# Altium footprint library connectors.PCBLIB: 188 footprints (part 1 of 12)
Each footprint in its own frame and in the unit in brackets; x right, y up, seen from the top. Pads: shape width x height; smd on the part's side, far side on the other; paste and mask are expansions set on the pad; w line width, h text height; cw(c..) or ccw(c..) is an arc to the next point about the centre after c.
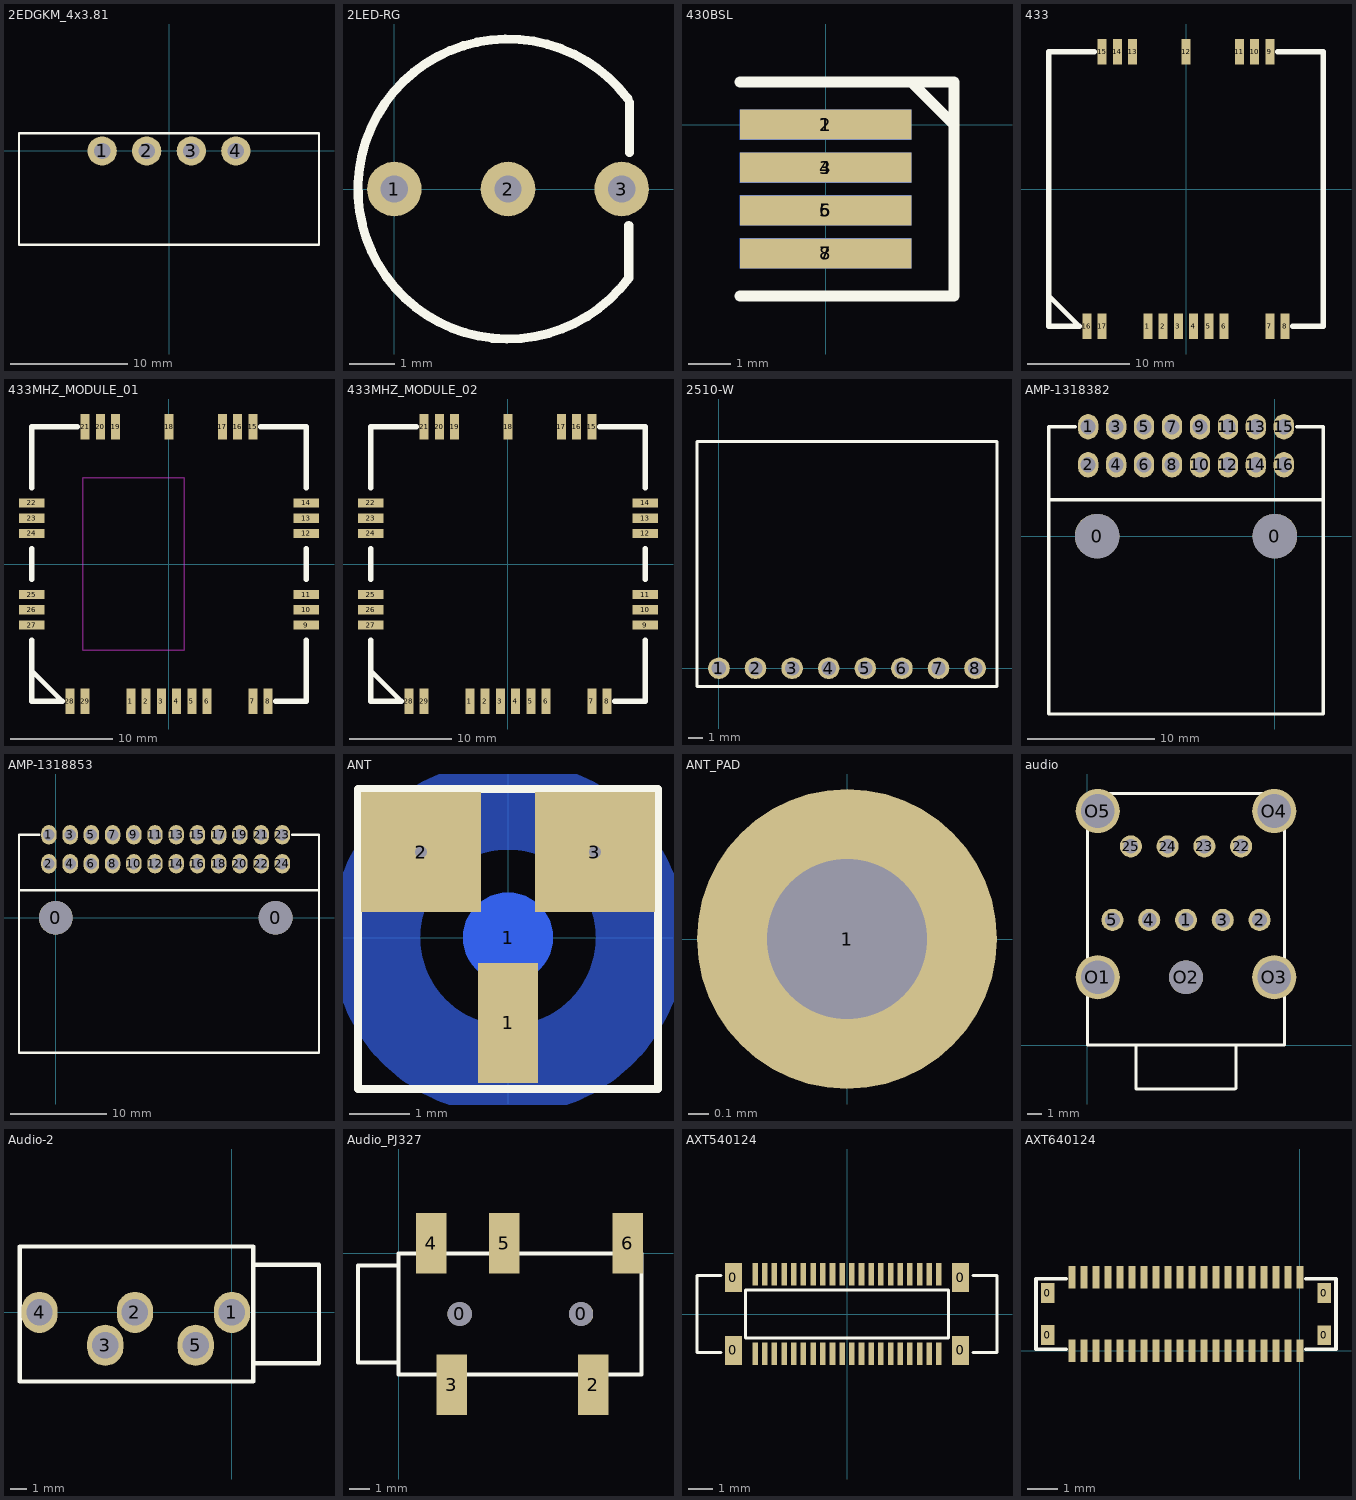
[diagram p0: the footprints below, top view; thin cyan lines are the x and y axes]

## 2EDGKM_4x3.81 [mm]
pads (4):
  round 2.5 hole 1.4: 1(-5.715,0) 2(-1.905,0) 3(1.905,0) 4(5.715,0)
Top Overlay:
  lines w0.203: -12.82,-8 -12.82,1.5 12.82,1.5 12.82,-8 -12.82,-8

## 2LED-RG [mm]
pads (3):
  round 1.2 hole 0.6: 1(0,0) 2(2.5,0) 3(5,0)
Top Overlay:
  lines w0.2: 5.136,1.985 ccw(c2.5,0) 5.157,-1.958 5.157,-0.8 ; 5.172,0.8 5.172,1.9

## 430BSL [mm]
pads (8):
  rect 4x0.7 smd: 1(0,0) 3(0,-1) 5(0,-2) 7(0,-3)
  rect 4x0.7 smd far side: 2(0,0) 4(0,-1) 6(0,-2) 8(0,-3)
Top Overlay:
  lines w0.254: -2,-4 3,-4 3,-2 3,1 -2,1 ; 3,0 2,1 ; 2,1 2,1
Bottom Overlay:
  lines w0.254: -2,-4 3,-4 3,1 -2,1

## 433 [mm]
pads (17):
  rect 0.9x2.5 smd: 1(-3.75,-13.5) 2(-2.25,-13.5) 3(-0.75,-13.5) 4(0.75,-13.5) 5(2.25,-13.5) 6(3.75,-13.5) 7(8.25,-13.5) 8(9.75,-13.5) 9(8.25,13.5) 10(6.75,13.5) 11(5.25,13.5) 12(0,13.5) 13(-5.25,13.5) 14(-6.75,13.5) 15(-8.25,13.5) 16(-9.75,-13.5) 17(-8.25,-13.5)
Top Overlay:
  lines w0.1: -13.5,-13.5 -10.5,-13.5 -13.5,-13.5
  lines w0.5: -13.5,-10.5 -10.5,-13.5 ; -9,13.5 -13.5,13.5 -13.5,7.5 -13.5,-7.5 -13.5,-13.5 -10.5,-13.5 ; 9,13.5 13.5,13.5 13.5,7.5 13.5,-7.5 13.5,-13.5 10.5,-13.5 ; -10.5,-13.5 -10.5,-13.5

## 433MHZ_MODULE_01 [mm]
pads (29):
  rect 0.9x2.5 smd: 1(-3.75,-13.5) 2(-2.25,-13.5) 3(-0.75,-13.5) 4(0.75,-13.5) 5(2.25,-13.5) 6(3.75,-13.5) 7(8.25,-13.5) 8(9.75,-13.5) 15(8.25,13.5) 16(6.75,13.5) 17(5.25,13.5) 18(0,13.5) 19(-5.25,13.5) 20(-6.75,13.5) 21(-8.25,13.5) 28(-9.75,-13.5) 29(-8.25,-13.5)
  rect 2.5x0.9 smd: 9(13.5,-6) 10(13.5,-4.5) 11(13.5,-3) 12(13.5,3) 13(13.5,4.5) 14(13.5,6) 22(-13.5,6) 23(-13.5,4.5) 24(-13.5,3) 25(-13.5,-3) 26(-13.5,-4.5) 27(-13.5,-6)
Top Overlay:
  lines w0.1: -13.5,-13.5 -10.5,-13.5 -13.5,-13.5
  lines w0.5: -13.5,-10.5 -10.5,-13.5 ; -13.5,-7.5 -13.5,-13.5 -10.5,-13.5 ; -13.5,-1.5 -13.5,1.5 ; -13.5,7.5 -13.5,13.5 -9,13.5 ; 9,13.5 13.5,13.5 13.5,7.5 ; 10.5,-13.5 13.5,-13.5 13.5,-7.5 ; 13.5,-1.5 13.5,1.5 ; -10.5,-13.5 -10.5,-13.5
Keep-Out Layer:
  lines w0.127: -8.5,-8.5 1.5,-8.5 1.5,8.5 -8.5,8.5 -8.5,-8.5

## 433MHZ_MODULE_02 [mm]
pads (29):
  rect 0.9x2.5 smd: 1(-3.75,-13.5) 2(-2.25,-13.5) 3(-0.75,-13.5) 4(0.75,-13.5) 5(2.25,-13.5) 6(3.75,-13.5) 7(8.25,-13.5) 8(9.75,-13.5) 15(8.25,13.5) 16(6.75,13.5) 17(5.25,13.5) 18(0,13.5) 19(-5.25,13.5) 20(-6.75,13.5) 21(-8.25,13.5) 28(-9.75,-13.5) 29(-8.25,-13.5)
  rect 2.5x0.9 smd: 9(13.5,-6) 10(13.5,-4.5) 11(13.5,-3) 12(13.5,3) 13(13.5,4.5) 14(13.5,6) 22(-13.5,6) 23(-13.5,4.5) 24(-13.5,3) 25(-13.5,-3) 26(-13.5,-4.5) 27(-13.5,-6)
Top Overlay:
  lines w0.1: -13.5,-13.5 -10.5,-13.5 -13.5,-13.5
  lines w0.5: -13.5,-10.5 -10.5,-13.5 ; -13.5,-7.5 -13.5,-13.5 -10.5,-13.5 ; -13.5,-1.5 -13.5,1.5 ; -13.5,7.5 -13.5,13.5 -9,13.5 ; 9,13.5 13.5,13.5 13.5,7.5 ; 10.5,-13.5 13.5,-13.5 13.5,-7.5 ; 13.5,-1.5 13.5,1.5 ; -10.5,-13.5 -10.5,-13.5

## 2510-W [mm]
pads (8):
  round 1.5 hole 1: 1(0,0) 2(2.54,0) 3(5.08,0) 4(7.62,0) 5(10.16,0) 6(12.7,0) 7(15.24,0) 8(17.78,0)
Top Overlay:
  lines w0.2: -1.524,-1.27 -1.524,15.748 19.304,15.748 19.304,-1.27 -1.524,-1.27

## AMP-1318382 [mm]
pads (18):
  round 3.5 hole 3.5: 0(-14,0) 0(0,0)
  oval 1.6x2 hole 1.2: 1(-14.7,8.6) 2(-14.7,5.6) 3(-12.5,8.6) 4(-12.5,5.6) 5(-10.3,8.6) 6(-10.3,5.6) 7(-8.1,8.6) 8(-8.1,5.6) 9(-5.9,8.6) 10(-5.9,5.6) 11(-3.7,8.6) 12(-3.7,5.6) 13(-1.5,8.6) 14(-1.5,5.6) 15(0.7,8.6) 16(0.7,5.6)
Top Overlay:
  lines w0.254: -17.8,2.85 3.8,2.85 ; -15.7,8.6 -17.8,8.6 ; 1.7,8.6 3.8,8.6 3.8,-14 -17.8,-14 -17.8,8.6 ; -17.8,8.6 -17.8,8.6

## AMP-1318853 [mm]
pads (26):
  round 3.5 hole 3.5: 0(0,0) 0(22.8,0)
  oval 1.6x2 hole 1.2: 1(-0.7,8.6) 2(-0.7,5.6) 3(1.5,8.6) 4(1.5,5.6) 5(3.7,8.6) 6(3.7,5.6) 7(5.9,8.6) 8(5.9,5.6) 9(8.1,8.6) 10(8.1,5.6) 11(10.3,8.6) 12(10.3,5.6) 13(12.5,8.6) 14(12.5,5.6) 15(14.7,8.6) 16(14.7,5.6) 17(16.9,8.6) 18(16.9,5.6) 19(19.1,8.6) 20(19.1,5.6) 21(21.3,8.6) 22(21.3,5.6) 23(23.5,8.6) 24(23.5,5.6)
Top Overlay:
  lines w0.254: -3.8,2.85 27.3,2.85 ; -1.7,8.6 -3.8,8.6 ; 24.5,8.6 27.3,8.6 27.3,-14 -3.8,-14 -3.8,8.6 ; -3.8,8.6 -3.8,8.6

## ANT [mm]
pads (4):
  rect 1x2 smd mask+0.051: 1(0,-1.425)
  round 1.5 smd far side: 1(0,0)
  rect 2x2 smd mask+0.051: 2(-1.45,1.425) 3(1.45,1.425)
via 1.45,1.425 diameter 0.406 hole 0.203
via -1.45,1.425 diameter 0.406 hole 0.203
Bottom Layer:
  circle w1.5: c0,0 r2.214
Top Overlay:
  lines w0.14: -2.5,-2.525 -2.5,2.475 2.5,2.475 2.5,-2.525 -2.5,-2.525
Bottom Solder:
  circle w1.5: c0,0 r2.215

## ANT_PAD [mm]
pads (1):
  round 1.5 hole 0.8: 1(0,0)

## audio [mm]
pads (14):
  round 1.5 hole 1: 1(6.7,8.518) 2(11.7,8.518) 3(9.2,8.518) 4(4.2,8.518) 5(1.7,8.518) 22(10.45,13.518) 23(7.95,13.518) 24(5.45,13.518) 25(2.95,13.518)
  round 3 hole 2.3: O1(0.7,4.618) O3(12.7,4.618) O4(12.7,15.918) O5(0.7,15.918)
  round 2.3 hole 2.3: O2(6.7,4.618)
Top Overlay:
  lines w0.203: 0,0 13.401,0 ; 0,0.068 0,17.1 13.401,17.1 ; 3.33,0 3.304,-0.026 3.304,-2.977 10.038,-2.977 10.083,-2.932 10.083,0 ; 13.401,0 13.401,17.1 ; 13.401,0 13.401,17.1

## Audio-2 [mm]
pads (5):
  oval 2.2x2.5 hole 1.6: 1(0,0) 2(-5.9,0) 3(-7.7,-2) 4(-11.7,0) 5(-2.2,-2)
Top Overlay:
  lines w0.254: 1.3,-3.1 5.3,-3.1 5.3,2.9 1.3,2.9 ; -12.9,-4.2 -12.9,4 1.3,4 1.3,-4.2 -12.9,-4.2

## Audio_PJ327 [mm]
pads (7):
  round 1.2 hole 1.2: 0(3,-3) 0(9,-3)
  rect 1.5x3 smd: 2(9.6,-6.5) 3(2.6,-6.5) 4(1.6,0.5) 5(5.2,0.5) 6(11.3,0.5)
Top Overlay:
  lines w0.2: -0.024,-6 -0.024,0 11.976,0 11.976,-6 -0.024,-6
  lines w0.203: -0.024,-5.4 -2.024,-5.4 -2.024,-0.6 -0.024,-0.6

## AXT540124 [mm]
pads (44):
  rect 0.7x1.2 smd: 0(-4.7,-1.5) 0(-4.7,1.5) 0(4.7,-1.5) 0(4.7,1.5)
  rect 0.23x0.92 smd: 1(-3.8,-1.64) 2(-3.8,1.64) 3(-3.4,-1.64) 4(-3.4,1.64) 5(-3,-1.64) 6(-3,1.64) 7(-2.6,-1.64) 8(-2.6,1.64) 9(-2.2,-1.64) 10(-2.2,1.64) 11(-1.8,-1.64) 12(-1.8,1.64) 13(-1.4,-1.64) 14(-1.4,1.64) 15(-1,-1.64) 16(-1,1.64) 17(-0.6,-1.64) 18(-0.6,1.64) 19(-0.2,-1.64) 20(-0.2,1.64) 21(0.2,-1.64) 22(0.2,1.64) 23(0.6,-1.64) 24(0.6,1.64) 25(1,-1.64) 26(1,1.64) 27(1.4,-1.64) 28(1.4,1.64) 29(1.8,-1.64) 30(1.8,1.64) 31(2.2,-1.64) 32(2.2,1.64) 33(2.6,-1.64) 34(2.6,1.64) 35(3,-1.64) 36(3,1.64) 37(3.4,-1.64) 38(3.4,1.64) 39(3.8,-1.64) 40(3.8,1.64)
Top Overlay:
  lines w0.127: -5.2,-1.6 -6.2,-1.6 -6.2,1.6 -5.2,1.6 ; 5.2,-1.6 6.2,-1.6 6.2,1.6 5.2,1.6 ; -4.2,-1 -4.2,1 4.2,1 4.2,-1 -4.2,-1

## AXT640124 [mm]
pads (44):
  rect 0.45x0.66 smd: 0(-8.4,0.523) 0(-8.4,1.928) 0(0.8,0.523) 0(0.8,1.928)
  rect 0.23x0.75 smd: 1(-7.6,0) 2(-7.6,2.45) 3(-7.2,0) 4(-7.2,2.455) 5(-6.8,0) 6(-6.8,2.45) 7(-6.4,0) 8(-6.4,2.45) 9(-6,0) 10(-6,2.45) 11(-5.6,0) 12(-5.6,2.45) 13(-5.2,0) 14(-5.2,2.45) 15(-4.8,0) 16(-4.8,2.45) 17(-4.4,0) 18(-4.4,2.45) 19(-4,0) 20(-4,2.45) 21(-3.6,0) 22(-3.6,2.45) 23(-3.2,0) 24(-3.2,2.45) 25(-2.8,0) 26(-2.8,2.45) 27(-2.4,0) 28(-2.4,2.45) 29(-2,0) 30(-2,2.45) 31(-1.6,0) 32(-1.6,2.45) 33(-1.2,0) 34(-1.2,2.45) 35(-0.8,0) 36(-0.8,2.45) 37(-0.4,0) 38(-0.4,2.45) 39(0,0) 40(0,2.455)
Top Overlay:
  lines w0.127: -7.8,0.05 -8.8,0.05 -8.8,2.4 -7.8,2.4 ; 0.2,0.05 1.2,0.05 1.2,2.4 0.2,2.4